# Altium footprint library Demo.PcbLib: 27 footprints (part 1 of 2)
Each footprint in its own frame and in the unit in brackets; x right, y up, seen from the top. Pads: shape width x height; smd on the part's side, far side on the other; paste and mask are expansions set on the pad; w line width, h text height; cw(c..) or ccw(c..) is an arc to the next point about the centre after c.
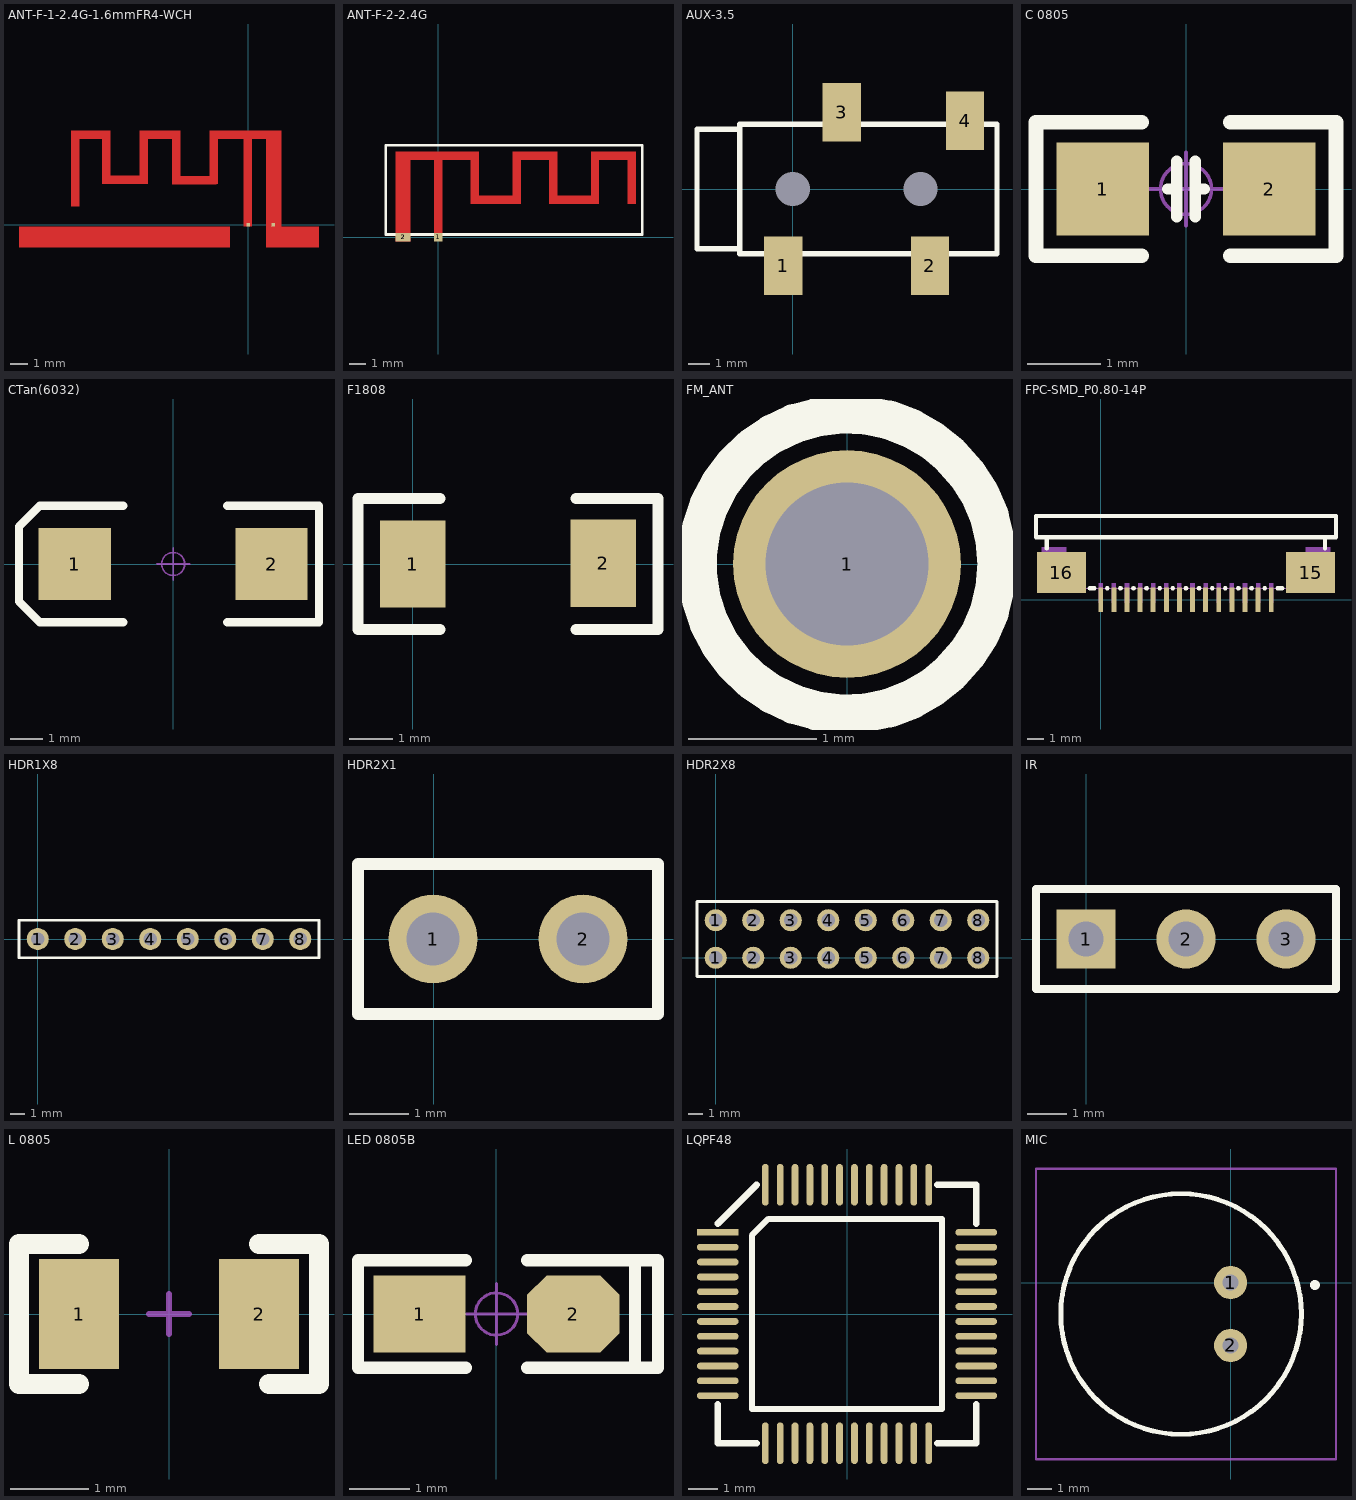
[diagram p0: the footprints below, top view; thin cyan lines are the x and y axes]

## ANT-F-1-2.4G-1.6mmFR4-WCH [mm]
pads (2):
  rect 0.2x0.2 smd mask+0: 0(1.483,0) 1(0,0)
Top Layer:
  rectangle: -13.408,-1.335 -1.064,-0.1
  rectangle: 1.04,-1.335 4.149,-0.1
  region: -9.86,5.18 -10.36,5.18 -10.36,1.06 -9.86,1.06
  region: -8.06,5.5 -10.36,5.5 -10.36,5 -8.06,5
  region: -8.06,5.181 -8.56,5.181 -8.56,2.361 -8.06,2.361
  region: -5.875,2.861 -8.364,2.861 -8.364,2.361 -5.875,2.361
  region: -5.86,5.181 -6.36,5.181 -6.36,2.361 -5.86,2.361
  region: -3.96,5.5 -6.36,5.5 -6.36,5 -3.96,5
  region: -3.96,5.18 -4.46,5.18 -4.46,2.36 -3.96,2.36
  region: -1.85,2.855 -4.39,2.855 -4.39,2.36 -1.85,2.36
  region: -1.76,5.181 -2.26,5.181 -2.26,2.361 -1.76,2.361
  region: 1.94,5.5 -2.26,5.5 -2.26,5 1.94,5
  region: 1.94,5.206 1.04,5.206 1.04,-0.1 1.94,-0.1
  region: 0.24,5.231 -0.26,5.231 -0.26,-0.1 0.24,-0.1
Mechanical 13:
  text "GND" at -9.082,-1.74 h0.89
  text "GND" at 1.225,-1.74 h0.89

## ANT-F-2-2.4G [mm]
pads (16):
  rect 0.5x0.5 smd: 1(0,0)
  rect 0.9x0.5 smd: 2(-2.1,0)
  rect 0.9x0.5 on Top Solder: 2(-2.1,0)
  rect 0.5x0.5 on Top Solder: ""(-2.3,4.9) ""(0,0) ""(0,4.4) ""(2.2,2.26) ""(2.2,4.9) ""(4.7,2.26) ""(4.7,4.9) ""(6.9,2.26) ""(6.9,4.9) ""(9.4,2.26) ""(9.4,4.9) ""(11.6,2.26) ""(11.6,4.9)
Top Layer:
  region: 7.15,2.01 7.15,5.15 6.65,5.15 6.65,2.01
  region: 7.15,4.65 7.15,5.15 4.449,5.15 4.449,4.65
  region: 4.95,2.01 4.95,5.15 4.449,5.15 4.449,2.01
  region: 4.95,2.01 4.95,2.51 1.95,2.51 1.95,2.01
  region: -1.65,-0.25 -1.65,5.15 -2.549,5.15 -2.549,-0.25
  region: 0.25,0.092 0.25,4.9 -0.251,4.9 -0.251,0.092
  region: 2.45,2.01 2.45,5.15 1.95,5.15 1.95,2.01
  region: 9.65,2.01 9.65,5.15 9.15,5.15 9.15,2.01
  region: 6.949,2.51 6.949,2.01 9.65,2.01 9.65,2.51
  region: 11.85,4.651 11.85,5.15 9.15,5.15 9.15,4.651
  region: 11.85,2.01 11.85,5.15 11.35,5.15 11.35,2.01
  lines w0.5: -2.3,4.9 2.2,4.9
Top Overlay:
  lines w0.15: -3.125,0.175 12.225,0.175 12.225,5.525 -3.125,5.525 -3.125,0.175
Top Solder:
  lines w0.5: -2.3,4.9 2.2,4.9 2.2,2.26 4.7,2.26 4.7,4.9 6.9,4.9 6.9,2.26 9.4,2.26 9.4,4.9 11.6,4.9 11.6,2.26 ; 0,0 0,4.9
  lines w0.9: -2.1,0.2 -2.1,4.7

## AUX-3.5 [mm]
pads (6):
  rect 1.8x2.75 smd: 1(-0.45,-3.6) 2(6.45,-3.6) 3(2.3,3.6) 4(8.1,3.2)
  round 1 hole 1.6 unplated: ""(0,0) ""(6,0)
Top Overlay:
  lines w0.254: -2.5,-2.8 -4.5,-2.8 -4.5,2.8 -2.5,2.8 ; -2.5,-2.8 -2.5,2.8 ; -2.5,-2.8 -2.5,-3.05 9.6,-3.05 9.6,3.05 -2.5,3.05 -2.5,2.8
3D body "SW3dPS-audio_buchse.STEP": height 4.06, standoff -0.01, extent -3.666,-3.457 8.304,3.877

## C 0805 [mil] "无极性贴片电容"
height 19.68
pads (2):
  rect 50x50 smd: 1(-45,0) 2(45,0)
Top Overlay:
  lines w6: -10,0 -5,0 ; -5,-15 -5,15 ; 5,-15 5,15 ; 5,0 10,0
  lines w8: -24,-36 -81,-36 -81,36 -24,36 ; 24,-36 81,-36 81,36 24,36
Mechanical 15:
  circle w1.97: c0,0 r13.78
  lines w1.97: -19.68,0 19.68,0 ; 0,-19.68 0,19.68
3D body "C 0805.STEP": height 20.08, standoff -0.39, extent -39.37,-24.02 39.37,24.02

## CTan(6032) [mm] "长6.0mm，宽3.2mm，厚2.5mm"
pads (2):
  rect 2.2x2.2 smd: 1(-3,0) 2(3,0)
Top Overlay:
  lines w0.254: -1.524,-1.778 -4.064,-1.778 -4.699,-1.143 -4.699,1.143 -4.064,1.778 -1.524,1.778 ; 1.651,-1.778 4.445,-1.778 4.445,1.778 1.651,1.778
Mechanical 15:
  circle w0.05: c0,0 r0.35
  lines w0.05: -0.5,0 0.5,0 ; 0,-0.5 0,0.5
3D body "CD C(6032).STEP": height 2.5, standoff -0.01, extent -3,-1.6 3,1.6

## F1808 [mil]
pads (2):
  rect 60x80 smd: 1(0,0) 2(174.88,0.76)
Top Overlay:
  lines w10: 25,-60 -50,-60 -50,60 25,60 ; 150,-60 225,-60 225,60 150,60
3D body "R1808(4520M)1.STEP": height 39.37, standoff 0, extent -2.88,-37.48 174.88,39

## FM_ANT [mil]
pads (1):
  round 70 hole 50: 1(0,0)
Top Overlay:
  circle w12: c0,0 r46.1

## FPC-SMD_P0.80-14P [mm]
pads (16):
  rect 0.3x1.5 smd mask+0.051: 1(0,0) 2(0.8,0) 3(1.6,0) 4(2.4,0) 5(3.2,0) 6(4,0) 7(4.8,0) 8(5.6,0) 9(6.4,0) 10(7.2,0) 11(8,0) 12(8.8,0) 13(9.6,0) 14(10.4,0)
  rect 3x2.5 smd mask+0.051: 15(12.802,1.65) 16(-2.398,1.65)
Top Overlay:
  lines w0.254: -3.288,3.131 -3.288,3.805 ; -0.667,0.695 -0.381,0.695 ; 0.381,0.695 0.419,0.695 ; 1.181,0.695 1.219,0.695 ; 1.981,0.695 2.019,0.695 ; 2.781,0.695 2.819,0.695 ; 3.581,0.695 3.619,0.695 ; 4.381,0.695 4.419,0.695 ; 5.181,0.695 5.219,0.695 ; 5.981,0.695 6.019,0.695 ; 6.781,0.695 6.819,0.695 ; 7.581,0.695 7.619,0.695 ; 8.381,0.695 8.419,0.695 ; 9.181,0.695 9.219,0.695 ; 9.981,0.695 10.019,0.695 ; 10.781,0.695 11.071,0.695 ; 13.682,3.131 13.682,3.805 ; -3.288,3.805 -3.948,3.805 -3.948,5.095 14.352,5.095 14.352,3.805 13.682,3.805 ; -3.288,3.805 13.682,3.805
Mechanical 15:
  region: 14.002,0.7 12.502,0.7 12.502,3.2 14.002,3.2
  region: -2.098,0.7 -3.598,0.7 -3.598,3.2 -2.098,3.2
  region: -0.125,1 0.125,1 0.125,-0.2 -0.125,-0.2
  region: 0.675,1 0.925,1 0.925,-0.2 0.675,-0.2
  region: 1.475,1 1.725,1 1.725,-0.2 1.475,-0.2
  region: 2.275,1 2.525,1 2.525,-0.2 2.275,-0.2
  region: 3.075,1 3.325,1 3.325,-0.2 3.075,-0.2
  region: 3.875,1 4.125,1 4.125,-0.2 3.875,-0.2
  region: 4.675,1 4.925,1 4.925,-0.2 4.675,-0.2
  region: 5.475,1 5.725,1 5.725,-0.2 5.475,-0.2
  region: 6.275,1 6.525,1 6.525,-0.2 6.275,-0.2
  region: 7.075,1 7.325,1 7.325,-0.2 7.075,-0.2
  region: 7.875,1 8.125,1 8.125,-0.2 7.875,-0.2
  region: 8.675,1 8.925,1 8.925,-0.2 8.675,-0.2
  region: 9.475,1 9.725,1 9.725,-0.2 9.475,-0.2
  region: 10.275,1 10.525,1 10.525,-0.2 10.275,-0.2
  lines w0.051: -3.948,3.8 -3.948,5.1 14.352,5.1 14.352,3.8 13.682,3.801 13.682,0.7 -3.278,0.7 -3.278,3.801 -3.948,3.8
3D body "130730.stp": height 1.84, standoff 0.09, extent -1.5,0.2 11.9,2.97

## HDR1X8 [mm]
height 1
pads (8):
  round 1.5 hole 0.9: 1(0,0) 2(2.54,0) 3(5.08,0) 4(7.62,0) 5(10.16,0) 6(12.7,0) 7(15.24,0) 8(17.78,0)
Top Overlay:
  lines w0.2: -1.27,-1.27 19.05,-1.27 19.05,1.27 -1.27,1.27 -1.27,-1.27
3D body "1001-8.STEP": height 8.54, standoff -3, extent -1.27,-1.27 19.05,1.27

## HDR2X1 [mm]
height 1.1
pads (2):
  round 1.5 hole 0.9: 1(-0.01,0.007) 2(2.53,0.007)
Top Overlay:
  lines w0.2: -1.28,-1.263 -1.28,1.277 3.8,1.277 3.8,-1.263 -1.28,-1.263
3D body "1x2HDR.stp": height 8.41, standoff -2.52, extent -1.279,-1.261 3.801,1.279

## HDR2X8 [mm]
pads (16):
  round 1.5 hole 0.9: 1(0,0) 1(0,2.54) 2(2.54,0) 2(2.54,2.54) 3(5.08,0) 3(5.08,2.54) 4(7.62,0) 4(7.62,2.54) 5(10.16,0) 5(10.16,2.54) 6(12.7,0) 6(12.7,2.54) 7(15.24,0) 7(15.24,2.54) 8(17.78,0) 8(17.78,2.54)
Top Overlay:
  lines w0.2: -1.27,-1.27 -1.27,3.81 19.05,3.81 19.05,-1.27 -1.27,-1.27
3D body "HDR2x8.STEP": height 8.54, standoff -3, extent -1.27,-1.27 19.05,3.81

## IR [mm]
pads (3):
  rect 1.5x1.5 hole 0.9: 1(0,0)
  round 1.5 hole 0.9: 2(2.54,0) 3(5.08,0)
Top Overlay:
  lines w0.2: -1.27,-1.27 6.35,-1.27 6.35,1.27 -1.27,1.27 -1.27,-1.27
3D body "User Library-IR reciver.STEP": height 10.48, standoff -2.63, extent -0.485,-3.997 5.515,3.789

## L 0805 [mil] "小功率贴片电感"
pads (2):
  rect 40x55 smd: 1(-45,0) 2(45,0)
Top Overlay:
  lines w10: -45,-35 -75,-35 -75,35 -45,35 ; 45,35 75,35 75,-35 50,-35
Mechanical 15:
  lines w3: -10,0 10,0 ; 0,-10 0,10
3D body "0805.STEP": height 35.43, standoff -0.11, extent -39.37,-23.62 39.37,23.62

## LED 0805B [mil] "蓝色0805LED                                    淘宝ID:黄晶宝石"
pads (2):
  rect 60x50 smd: 1(-50,0)
  oct 60x50 smd: 2(50,0)
Top Overlay:
  lines w8: -20,-35 -90,-35 -90,35 -20,35 ; 20,-35 105,-35 105,35 20,35 ; 90,-35 90,35
Mechanical 15:
  circle w1.97: c0,0 r13.78
  lines w1.97: -19.68,0 19.68,0 ; 0,-19.68 0,19.68
3D body "LED 0805玻璃罩.STEP": height 31.69, standoff 12.01, extent -29.49,-24.65 29.49,24.65
3D body "LED 0805-B.STEP": height 26.33, standoff -0.16, extent -39.37,-24.65 39.37,24.65

## LQPF48 [mm]
pads (48):
  rect 1.4x0.229 smd mask+0.051: 1(-4.35,2.75)
  oval 1.4x0.229 smd mask+0.051: 2(-4.35,2.25) 3(-4.35,1.75) 4(-4.35,1.25) 5(-4.35,0.75) 6(-4.35,0.25) 7(-4.35,-0.25) 8(-4.35,-0.75) 9(-4.35,-1.25) 10(-4.35,-1.75) 11(-4.35,-2.25) 12(-4.35,-2.75) 25(4.35,-2.75) 26(4.35,-2.25) 27(4.35,-1.75) 28(4.35,-1.25) 29(4.35,-0.75) 30(4.35,-0.25) 31(4.35,0.25) 32(4.35,0.75) 33(4.35,1.25) 34(4.35,1.75) 35(4.35,2.25) 36(4.35,2.75)
  oval 0.229x1.4 smd mask+0.051: 13(-2.75,-4.35) 14(-2.25,-4.35) 15(-1.75,-4.35) 16(-1.25,-4.35) 17(-0.75,-4.35) 18(-0.25,-4.35) 19(0.25,-4.35) 20(0.75,-4.35) 21(1.25,-4.35) 22(1.75,-4.35) 23(2.25,-4.35) 24(2.75,-4.35) 37(2.75,4.35) 38(2.25,4.35) 39(1.75,4.35) 40(1.25,4.35) 41(0.75,4.35) 42(0.25,4.35) 43(-0.25,4.35) 44(-0.75,4.35) 45(-1.25,4.35) 46(-1.75,4.35) 47(-2.25,4.35) 48(-2.75,4.35)
Top Overlay:
  lines w0.203: -3.2,-3.2 -3.2,2.65 -2.65,3.2 3.2,3.2 3.2,-3.2 -3.2,-3.2
  lines w0.229: -4.35,-3.05 -4.35,-4.35 -3.05,-4.35 ; -4.35,3.05 -3.05,4.35 ; 3.05,-4.35 4.35,-4.35 4.35,-3.05 ; 3.05,4.35 4.35,4.35 4.35,3.05
3D body "TQFP48.STEP": height 1.1, standoff 0, extent -4.483,-4.509 4.534,4.509

## MIC [mm]
pads (2):
  round 1.333 hole 0.65: 1(0,0) 2(0,-2.54)
Top Overlay:
  lines w0.2: -2,-6.12 ccw(c-2,-1.27) -2,3.58 ccw(c-2,-1.27) -2,-6.12 ; 3.4,-0.2 ccw(c3.4,-0.1) 3.4,0 ccw(c3.4,-0.1) 3.4,-0.2
Mechanical 15:
  lines w0.1: -2,-6.12 ccw(c-2,-1.27) -2,3.58 ccw(c-2,-1.27) -2,-6.12
Mechanical 20:
  lines w0.1: -7.85,-7.12 -7.85,4.58 4.25,4.58 4.25,-7.12 -7.85,-7.12
3D body "CMA-4544PF-W.stp": height 4.86, standoff -4.44, extent -6.87,-6.08 2.83,3.62